# Altium integrated library Lattice CPLD ispLSI.IntLib: 471 symbols (part 1 of 26) (continued)
## ispLSI1016E-125LJ (continued)

## ispLSI1016E-125LT44
designator U?
In-System Programmable High-Density PLD; Note: Pins 8, 18, 27, 30 & 40 have dual function capability; Pin 40 is software selectable.; Published: 23-Sep-2002; LatestRevisionDate: 13-Apr-2006; LatestRevisionNote: IPC-7351 Footprint Added.; DatasheetVersion: Oct-1998; PackageVersion: pkg_32, Aug-2005; PackageReference: TQFP44; Publisher: Altium Limited; PackageDescription: 44-Pin Thin Quad Flat Pack 0.8 mm Pitch; ComponentLink1Description: Manufacturer Link; ComponentLink1URL: http://www.latticesemi.com/products/mature/index.cfm; ComponentLink2Description: Datasheet; ComponentLink2URL: http://www.latticesemi.com/lit/docs/datasheets/cpld/1016e.pdf
footprint TQFP44_N (Thin QFP, 44-Leads, Body 10x10mm, Pitch 0.8mm, IPC Medium Density)
footprint TQFP44_L (Thin QFP, 44-Leads, Body 10x10mm, Pitch 0.8mm, IPC High Density)
footprint TQFP44_M (Thin QFP, 44-Leads, Body 10x10mm, Pitch 0.8mm, IPC Low Density)
3D model 1016E-TQFP44 (44-Pin Thin Quad Flat Pack 0.8 mm Pitch)
pins: 1 I/O28 (io), 2 I/O29 (io), 3 I/O30 (io), 4 I/O31 (io), 5 Y0 (in), 6 VCC (power), 7 ~{ispEN} (in), 8 SDI/IN0 (in), 9 I/O0 (io), 10 I/O1 (io), 11 I/O2 (io), 12 I/O3 (io), 13 I/O4 (io), 14 I/O5 (io), 15 I/O6 (io), 16 I/O7 (io), 17 GND (power), 18 SDO/IN1 (io), 19 I/O8 (io), 20 I/O9 (io), 21 I/O10 (io), 22 I/O11 (io), 23 I/O12 (io), 24 I/O13 (io), 25 I/O14 (io), 26 I/O15 (io), 27 Y2/SCLK (in), 28 VCC (power), 29 Y1/~{RESET} (in), 30 MODE/IN2 (in), 31 I/O16 (io), 32 I/O17 (io), 33 I/O18 (io), 34 I/O19 (io), 35 I/O20 (io), 36 I/O21 (io), 37 I/O22 (io), 38 I/O23 (io), 39 GND (power), 40 GOE0/IN3 (in), 41 I/O24 (io), 42 I/O25 (io), 43 I/O26 (io), 44 I/O27 (io)

## ispLSI1016EA-100LJ44
designator U?
In-System Programmable High-Density PLD; Note: Pins 2 and 35 have dual function capability which is software selectable.; Published: 23-Sep-2002; LatestRevisionDate: 13-Apr-2006; LatestRevisionNote: IPC-7351 Footprint Added.; DatasheetVersion: Jun-2000; PackageVersion: pkg_32, Aug-2005; PackageReference: PLCC44; Publisher: Altium Limited; PackageDescription: 44-Pin Leaded Chip Carrier 1.27 mm Pitch; Code_IPC: PLCC-44; ComponentLink1Description: Manufacturer Link; ComponentLink1URL: http://www.latticesemi.com/products/mature/index.cfm; ComponentLink2Description: Datasheet; ComponentLink2URL: http://www.latticesemi.com/lit/docs/datasheets/cpld/1016ea.pdf
footprint PLCC44_N (Leaded Chip Carrier, 44-Leads, Body 16.6x16.6mm, Pitch 1.27mm, IPC Medium Density)
footprint PLCC44_L (Leaded Chip Carrier, 44-Leads, Body 16.6x16.6mm, Pitch 1.27mm, IPC High Density)
footprint PLCC44_M (Leaded Chip Carrier, 44-Leads, Body 16.6x16.6mm, Pitch 1.27mm, IPC Low Density)
3D model 1016EA-PLCC44 (44-Pin Leaded Chip Carrier 1.27 mm Pitch)
pins: 1 GND (power), 2 GOE0/IN3 (in), 3 I/O24 (io), 4 I/O25 (io), 5 I/O26 (io), 6 I/O27 (io), 7 I/O28 (io), 8 I/O29 (io), 9 I/O30 (io), 10 I/O31 (io), 11 Y0 (in), 12 VCC (power), 13 VCCIO (power), 14 TDI (in), 15 I/O0 (io), 16 I/O1 (io), 17 I/O2 (io), 18 I/O3 (io), 19 I/O4 (io), 20 I/O5 (io), 21 I/O6 (io), 22 I/O7 (io), 23 GND (power), 24 TDO (in), 25 I/O8 (io), 26 I/O9 (io), 27 I/O10 (io), 28 I/O11 (io), 29 I/O12 (io), 30 I/O13 (io), 31 I/O14 (io), 32 I/O15 (io), 33 TCK (in), 34 VCC (power), 35 Y1/~{RESET} (in), 36 TMS (in), 37 I/O16 (io), 38 I/O17 (io), 39 I/O18 (io), 40 I/O19 (io), 41 I/O20 (io), 42 I/O21 (io), 43 I/O22 (io), 44 I/O23 (io)

## ispLSI1016EA-100LT44
designator U?
In-System Programmable High-Density PLD; Note: Pins 2 and 35 have dual function capability which is software selectable.; Published: 23-Sep-2002; LatestRevisionDate: 13-Apr-2006; LatestRevisionNote: IPC-7351 Footprint Added.; DatasheetVersion: Jun-2000; PackageVersion: pkg_32, Aug-2005; PackageReference: TQFP44; Publisher: Altium Limited; PackageDescription: 44-Pin Thin Quad Flat Pack 0.8 mm Pitch; ComponentLink1Description: Manufacturer Link; ComponentLink1URL: http://www.latticesemi.com/products/mature/index.cfm; ComponentLink2Description: Datasheet; ComponentLink2URL: http://www.latticesemi.com/lit/docs/datasheets/cpld/1016ea.pdf
footprint TQFP44_N (Thin QFP, 44-Leads, Body 10x10mm, Pitch 0.8mm, IPC Medium Density)
footprint TQFP44_L (Thin QFP, 44-Leads, Body 10x10mm, Pitch 0.8mm, IPC High Density)
footprint TQFP44_M (Thin QFP, 44-Leads, Body 10x10mm, Pitch 0.8mm, IPC Low Density)
3D model 1016EA-TQFP44 (44-Pin Thin Quad Flat Pack 0.8 mm Pitch)
pins: 1 I/O28 (io), 2 I/O29 (io), 3 I/O30 (io), 4 I/O31 (io), 5 Y0 (in), 6 VCC (power), 7 VCCIO (power), 8 TDI (in), 9 I/O0 (io), 10 I/O1 (io), 11 I/O2 (io), 12 I/O3 (io), 13 I/O4 (io), 14 I/O5 (io), 15 I/O6 (io), 16 I/O7 (io), 17 GND (power), 18 TDO (in), 19 I/O8 (io), 20 I/O9 (io), 21 I/O10 (io), 22 I/O11 (io), 23 I/O12 (io), 24 I/O13 (io), 25 I/O14 (io), 26 I/O15 (io), 27 TCK (in), 28 VCC (power), 29 Y1/~{RESET} (in), 30 TMS (in), 31 I/O16 (io), 32 I/O17 (io), 33 I/O18 (io), 34 I/O19 (io), 35 I/O20 (io), 36 I/O21 (io), 37 I/O22 (io), 38 I/O23 (io), 39 GND (power), 40 GOE0/IN3 (in), 41 I/O24 (io), 42 I/O25 (io), 43 I/O26 (io), 44 I/O27 (io)

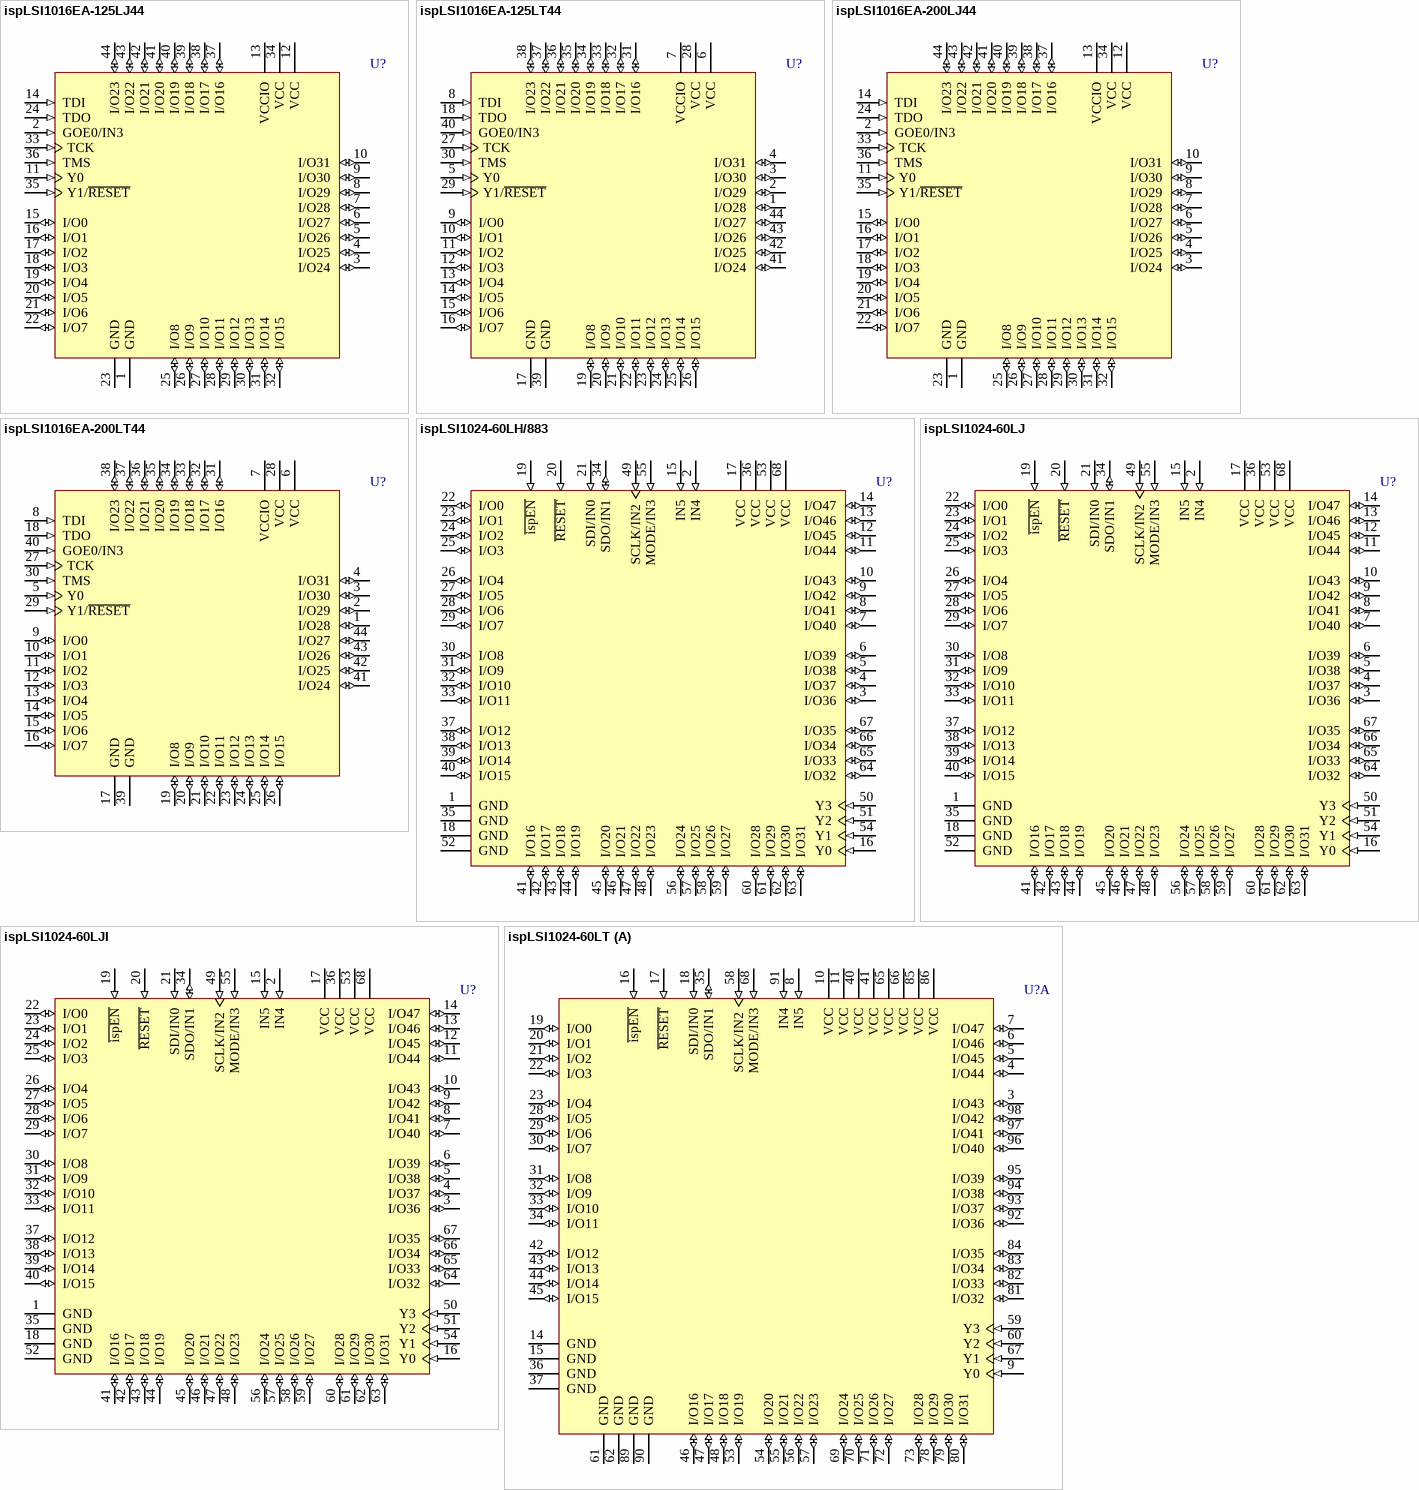
[diagram p3: symbols ispLSI1016EA-125LJ44 to ispLSI1024-60LT]

## ispLSI1016EA-125LJ44
designator U?
In-System Programmable High-Density PLD; Note: Pins 2 and 35 have dual function capability which is software selectable.; Published: 23-Sep-2002; LatestRevisionDate: 13-Apr-2006; LatestRevisionNote: IPC-7351 Footprint Added.; DatasheetVersion: Jun-2000; PackageVersion: pkg_32, Aug-2005; PackageReference: PLCC44; Publisher: Altium Limited; PackageDescription: 44-Pin Leaded Chip Carrier 1.27 mm Pitch; Code_IPC: PLCC-44; ComponentLink1Description: Manufacturer Link; ComponentLink1URL: http://www.latticesemi.com/products/mature/index.cfm; ComponentLink2Description: Datasheet; ComponentLink2URL: http://www.latticesemi.com/lit/docs/datasheets/cpld/1016ea.pdf
footprint PLCC44_N (Leaded Chip Carrier, 44-Leads, Body 16.6x16.6mm, Pitch 1.27mm, IPC Medium Density)
footprint PLCC44_L (Leaded Chip Carrier, 44-Leads, Body 16.6x16.6mm, Pitch 1.27mm, IPC High Density)
footprint PLCC44_M (Leaded Chip Carrier, 44-Leads, Body 16.6x16.6mm, Pitch 1.27mm, IPC Low Density)
3D model 1016EA-PLCC44 (44-Pin Leaded Chip Carrier 1.27 mm Pitch)
pins: 1 GND (power), 2 GOE0/IN3 (in), 3 I/O24 (io), 4 I/O25 (io), 5 I/O26 (io), 6 I/O27 (io), 7 I/O28 (io), 8 I/O29 (io), 9 I/O30 (io), 10 I/O31 (io), 11 Y0 (in), 12 VCC (power), 13 VCCIO (power), 14 TDI (in), 15 I/O0 (io), 16 I/O1 (io), 17 I/O2 (io), 18 I/O3 (io), 19 I/O4 (io), 20 I/O5 (io), 21 I/O6 (io), 22 I/O7 (io), 23 GND (power), 24 TDO (in), 25 I/O8 (io), 26 I/O9 (io), 27 I/O10 (io), 28 I/O11 (io), 29 I/O12 (io), 30 I/O13 (io), 31 I/O14 (io), 32 I/O15 (io), 33 TCK (in), 34 VCC (power), 35 Y1/~{RESET} (in), 36 TMS (in), 37 I/O16 (io), 38 I/O17 (io), 39 I/O18 (io), 40 I/O19 (io), 41 I/O20 (io), 42 I/O21 (io), 43 I/O22 (io), 44 I/O23 (io)

## ispLSI1016EA-125LT44
designator U?
In-System Programmable High-Density PLD; Note: Pins 2 and 35 have dual function capability which is software selectable.; Published: 23-Sep-2002; LatestRevisionDate: 13-Apr-2006; LatestRevisionNote: IPC-7351 Footprint Added.; DatasheetVersion: Jun-2000; PackageVersion: pkg_32, Aug-2005; PackageReference: TQFP44; Publisher: Altium Limited; PackageDescription: 44-Pin Thin Quad Flat Pack 0.8 mm Pitch; ComponentLink1Description: Manufacturer Link; ComponentLink1URL: http://www.latticesemi.com/products/mature/index.cfm; ComponentLink2Description: Datasheet; ComponentLink2URL: http://www.latticesemi.com/lit/docs/datasheets/cpld/1016ea.pdf
footprint TQFP44_N (Thin QFP, 44-Leads, Body 10x10mm, Pitch 0.8mm, IPC Medium Density)
footprint TQFP44_L (Thin QFP, 44-Leads, Body 10x10mm, Pitch 0.8mm, IPC High Density)
footprint TQFP44_M (Thin QFP, 44-Leads, Body 10x10mm, Pitch 0.8mm, IPC Low Density)
3D model 1016EA-TQFP44 (44-Pin Thin Quad Flat Pack 0.8 mm Pitch)
pins: 1 I/O28 (io), 2 I/O29 (io), 3 I/O30 (io), 4 I/O31 (io), 5 Y0 (in), 6 VCC (power), 7 VCCIO (power), 8 TDI (in), 9 I/O0 (io), 10 I/O1 (io), 11 I/O2 (io), 12 I/O3 (io), 13 I/O4 (io), 14 I/O5 (io), 15 I/O6 (io), 16 I/O7 (io), 17 GND (power), 18 TDO (in), 19 I/O8 (io), 20 I/O9 (io), 21 I/O10 (io), 22 I/O11 (io), 23 I/O12 (io), 24 I/O13 (io), 25 I/O14 (io), 26 I/O15 (io), 27 TCK (in), 28 VCC (power), 29 Y1/~{RESET} (in), 30 TMS (in), 31 I/O16 (io), 32 I/O17 (io), 33 I/O18 (io), 34 I/O19 (io), 35 I/O20 (io), 36 I/O21 (io), 37 I/O22 (io), 38 I/O23 (io), 39 GND (power), 40 GOE0/IN3 (in), 41 I/O24 (io), 42 I/O25 (io), 43 I/O26 (io), 44 I/O27 (io)

## ispLSI1016EA-200LJ44
designator U?
In-System Programmable High-Density PLD; Note: Pins 2 and 35 have dual function capability which is software selectable.; Published: 23-Sep-2002; LatestRevisionDate: 13-Apr-2006; LatestRevisionNote: IPC-7351 Footprint Added.; DatasheetVersion: Jun-2000; PackageVersion: pkg_32, Aug-2005; PackageReference: PLCC44; Publisher: Altium Limited; PackageDescription: 44-Pin Leaded Chip Carrier 1.27 mm Pitch; Code_IPC: PLCC-44; ComponentLink1Description: Manufacturer Link; ComponentLink1URL: http://www.latticesemi.com/products/mature/index.cfm; ComponentLink2Description: Datasheet; ComponentLink2URL: http://www.latticesemi.com/lit/docs/datasheets/cpld/1016ea.pdf
footprint PLCC44_N (Leaded Chip Carrier, 44-Leads, Body 16.6x16.6mm, Pitch 1.27mm, IPC Medium Density)
footprint PLCC44_L (Leaded Chip Carrier, 44-Leads, Body 16.6x16.6mm, Pitch 1.27mm, IPC High Density)
footprint PLCC44_M (Leaded Chip Carrier, 44-Leads, Body 16.6x16.6mm, Pitch 1.27mm, IPC Low Density)
3D model 1016EA-PLCC44 (44-Pin Leaded Chip Carrier 1.27 mm Pitch)
pins: 1 GND (power), 2 GOE0/IN3 (in), 3 I/O24 (io), 4 I/O25 (io), 5 I/O26 (io), 6 I/O27 (io), 7 I/O28 (io), 8 I/O29 (io), 9 I/O30 (io), 10 I/O31 (io), 11 Y0 (in), 12 VCC (power), 13 VCCIO (power), 14 TDI (in), 15 I/O0 (io), 16 I/O1 (io), 17 I/O2 (io), 18 I/O3 (io), 19 I/O4 (io), 20 I/O5 (io), 21 I/O6 (io), 22 I/O7 (io), 23 GND (power), 24 TDO (in), 25 I/O8 (io), 26 I/O9 (io), 27 I/O10 (io), 28 I/O11 (io), 29 I/O12 (io), 30 I/O13 (io), 31 I/O14 (io), 32 I/O15 (io), 33 TCK (in), 34 VCC (power), 35 Y1/~{RESET} (in), 36 TMS (in), 37 I/O16 (io), 38 I/O17 (io), 39 I/O18 (io), 40 I/O19 (io), 41 I/O20 (io), 42 I/O21 (io), 43 I/O22 (io), 44 I/O23 (io)

## ispLSI1016EA-200LT44
designator U?
In-System Programmable High-Density PLD; Note: Pins 2 and 35 have dual function capability which is software selectable.; Published: 23-Sep-2002; LatestRevisionDate: 13-Apr-2006; LatestRevisionNote: IPC-7351 Footprint Added.; DatasheetVersion: Jun-2000; PackageVersion: pkg_32, Aug-2005; PackageReference: TQFP44; Publisher: Altium Limited; PackageDescription: 44-Pin Thin Quad Flat Pack 0.8 mm Pitch; ComponentLink1Description: Manufacturer Link; ComponentLink1URL: http://www.latticesemi.com/products/mature/index.cfm; ComponentLink2Description: Datasheet; ComponentLink2URL: http://www.latticesemi.com/lit/docs/datasheets/cpld/1016ea.pdf
footprint TQFP44_N (Thin QFP, 44-Leads, Body 10x10mm, Pitch 0.8mm, IPC Medium Density)
footprint TQFP44_L (Thin QFP, 44-Leads, Body 10x10mm, Pitch 0.8mm, IPC High Density)
footprint TQFP44_M (Thin QFP, 44-Leads, Body 10x10mm, Pitch 0.8mm, IPC Low Density)
3D model 1016EA-TQFP44 (44-Pin Thin Quad Flat Pack 0.8 mm Pitch)
pins: 1 I/O28 (io), 2 I/O29 (io), 3 I/O30 (io), 4 I/O31 (io), 5 Y0 (in), 6 VCC (power), 7 VCCIO (power), 8 TDI (in), 9 I/O0 (io), 10 I/O1 (io), 11 I/O2 (io), 12 I/O3 (io), 13 I/O4 (io), 14 I/O5 (io), 15 I/O6 (io), 16 I/O7 (io), 17 GND (power), 18 TDO (in), 19 I/O8 (io), 20 I/O9 (io), 21 I/O10 (io), 22 I/O11 (io), 23 I/O12 (io), 24 I/O13 (io), 25 I/O14 (io), 26 I/O15 (io), 27 TCK (in), 28 VCC (power), 29 Y1/~{RESET} (in), 30 TMS (in), 31 I/O16 (io), 32 I/O17 (io), 33 I/O18 (io), 34 I/O19 (io), 35 I/O20 (io), 36 I/O21 (io), 37 I/O22 (io), 38 I/O23 (io), 39 GND (power), 40 GOE0/IN3 (in), 41 I/O24 (io), 42 I/O25 (io), 43 I/O26 (io), 44 I/O27 (io)

## ispLSI1024-60LH/883
designator U?
High-Density Programmable Logic; Published: 8-Jun-2000; LatestRevisionDate: 13-Apr-2006; LatestRevisionNote: IPC-7351 Footprint Added.; DatasheetVersion: 1994; PackageVersion: pkg_32, Aug-2005; PackageReference: JLCC68; Publisher: Altium Limited; PackageDescription: 68-Pin Leaded Chip Carrier 1.27 mm Pitch; ComponentLink1Description: Manufacturer Link; ComponentLink1URL: http://www.latticesemi.com/products/mature/index.cfm; ComponentLink2Description: Datasheet; ComponentLink2URL: http://www.latticesemi.com/lit/docs/military/1024.pdf
footprint JLCC68_N (Leaded Chip Carrier, 68-Leads, Body 24x24mm, Pitch 1.27mm, IPC Medium Density)
footprint JLCC68_L (Leaded Chip Carrier, 68-Leads, Body 24x24mm, Pitch 1.27mm, IPC High Density)
footprint JLCC68_M (Leaded Chip Carrier, 68-Leads, Body 24x24mm, Pitch 1.27mm, IPC Low Density)
3D model 1024-JLCC68 (68-Pin Leaded Chip Carrier 1.27 mm Pitch)
pins: 1 GND (power), 2 IN4 (in), 3 I/O36 (io), 4 I/O37 (io), 5 I/O38 (io), 6 I/O39 (io), 7 I/O40 (io), 8 I/O41 (io), 9 I/O42 (io), 10 I/O43 (io), 11 I/O44 (io), 12 I/O45 (io), 13 I/O46 (io), 14 I/O47 (io), 15 IN5 (in), 16 Y0 (in), 17 VCC (power), 18 GND (power), 19 ~{ispEN} (in), 20 ~{RESET} (in), 21 SDI/IN0 (in), 22 I/O0 (io), 23 I/O1 (io), 24 I/O2 (io), 25 I/O3 (io), 26 I/O4 (io), 27 I/O5 (io), 28 I/O6 (io), 29 I/O7 (io), 30 I/O8 (io), 31 I/O9 (io), 32 I/O10 (io), 33 I/O11 (io), 34 SDO/IN1 (io), 35 GND (power), 36 VCC (power), 37 I/O12 (io), 38 I/O13 (io), 39 I/O14 (io), 40 I/O15 (io), 41 I/O16 (io), 42 I/O17 (io), 43 I/O18 (io), 44 I/O19 (io), 45 I/O20 (io), 46 I/O21 (io), 47 I/O22 (io), 48 I/O23 (io), 49 SCLK/IN2 (in), 50 Y3 (in), 51 Y2 (in), 52 GND (power), 53 VCC (power), 54 Y1 (in), 55 MODE/IN3 (in), 56 I/O24 (io), 57 I/O25 (io), 58 I/O26 (io), 59 I/O27 (io), 60 I/O28 (io), 61 I/O29 (io), 62 I/O30 (io), 63 I/O31 (io), 64 I/O32 (io), 65 I/O33 (io), 66 I/O34 (io), 67 I/O35 (io), 68 VCC (power)

## ispLSI1024-60LJ
designator U?
High-Density Programmable Logic; Published: 8-Jun-2000; LatestRevisionDate: 13-Apr-2006; LatestRevisionNote: IPC-7351 Footprint Added.; DatasheetVersion: 1994; PackageVersion: pkg_32, Aug-2005; PackageReference: PLCC68; Publisher: Altium Limited; PackageDescription: 68-Pin Leaded Chip Carrier 1.27 mm Pitch; Code_IPC: PLCC-68; ComponentLink1Description: Manufacturer Link; ComponentLink1URL: http://www.latticesemi.com/products/mature/index.cfm; ComponentLink2Description: Datasheet; ComponentLink2URL: http://www.latticesemi.com/lit/docs/datasheets/cpld/1024.pdf
footprint PLCC68_N (Leaded Chip Carrier, 68-Leads, Body 24x24mm, Pitch 1.27mm, IPC Medium Density)
footprint PLCC68_L (Leaded Chip Carrier, 68-Leads, Body 24x24mm, Pitch 1.27mm, IPC High Density)
footprint PLCC68_M (Leaded Chip Carrier, 68-Leads, Body 24x24mm, Pitch 1.27mm, IPC Low Density)
3D model 1024-PLCC68 (68-Pin Leaded Chip Carrier 1.27 mm Pitch)
pins: 1 GND (power), 2 IN4 (in), 3 I/O36 (io), 4 I/O37 (io), 5 I/O38 (io), 6 I/O39 (io), 7 I/O40 (io), 8 I/O41 (io), 9 I/O42 (io), 10 I/O43 (io), 11 I/O44 (io), 12 I/O45 (io), 13 I/O46 (io), 14 I/O47 (io), 15 IN5 (in), 16 Y0 (in), 17 VCC (power), 18 GND (power), 19 ~{ispEN} (in), 20 ~{RESET} (in), 21 SDI/IN0 (in), 22 I/O0 (io), 23 I/O1 (io), 24 I/O2 (io), 25 I/O3 (io), 26 I/O4 (io), 27 I/O5 (io), 28 I/O6 (io), 29 I/O7 (io), 30 I/O8 (io), 31 I/O9 (io), 32 I/O10 (io), 33 I/O11 (io), 34 SDO/IN1 (io), 35 GND (power), 36 VCC (power), 37 I/O12 (io), 38 I/O13 (io), 39 I/O14 (io), 40 I/O15 (io), 41 I/O16 (io), 42 I/O17 (io), 43 I/O18 (io), 44 I/O19 (io), 45 I/O20 (io), 46 I/O21 (io), 47 I/O22 (io), 48 I/O23 (io), 49 SCLK/IN2 (in), 50 Y3 (in), 51 Y2 (in), 52 GND (power), 53 VCC (power), 54 Y1 (in), 55 MODE/IN3 (in), 56 I/O24 (io), 57 I/O25 (io), 58 I/O26 (io), 59 I/O27 (io), 60 I/O28 (io), 61 I/O29 (io), 62 I/O30 (io), 63 I/O31 (io), 64 I/O32 (io), 65 I/O33 (io), 66 I/O34 (io), 67 I/O35 (io), 68 VCC (power)

## ispLSI1024-60LJI
designator U?
High-Density Programmable Logic; Published: 8-Jun-2000; LatestRevisionDate: 13-Apr-2006; LatestRevisionNote: IPC-7351 Footprint Added.; DatasheetVersion: 1994; PackageVersion: pkg_32, Aug-2005; PackageReference: PLCC68; Publisher: Altium Limited; PackageDescription: 68-Pin Leaded Chip Carrier 1.27 mm Pitch; Code_IPC: PLCC-68; ComponentLink1Description: Manufacturer Link; ComponentLink1URL: http://www.latticesemi.com/products/mature/index.cfm; ComponentLink2Description: Datasheet; ComponentLink2URL: http://www.latticesemi.com/lit/docs/datasheets/cpld/1024.pdf
footprint PLCC68_N (Leaded Chip Carrier, 68-Leads, Body 24x24mm, Pitch 1.27mm, IPC Medium Density)
footprint PLCC68_L (Leaded Chip Carrier, 68-Leads, Body 24x24mm, Pitch 1.27mm, IPC High Density)
footprint PLCC68_M (Leaded Chip Carrier, 68-Leads, Body 24x24mm, Pitch 1.27mm, IPC Low Density)
3D model 1024-PLCC68 (68-Pin Leaded Chip Carrier 1.27 mm Pitch)
pins: 1 GND (power), 2 IN4 (in), 3 I/O36 (io), 4 I/O37 (io), 5 I/O38 (io), 6 I/O39 (io), 7 I/O40 (io), 8 I/O41 (io), 9 I/O42 (io), 10 I/O43 (io), 11 I/O44 (io), 12 I/O45 (io), 13 I/O46 (io), 14 I/O47 (io), 15 IN5 (in), 16 Y0 (in), 17 VCC (power), 18 GND (power), 19 ~{ispEN} (in), 20 ~{RESET} (in), 21 SDI/IN0 (in), 22 I/O0 (io), 23 I/O1 (io), 24 I/O2 (io), 25 I/O3 (io), 26 I/O4 (io), 27 I/O5 (io), 28 I/O6 (io), 29 I/O7 (io), 30 I/O8 (io), 31 I/O9 (io), 32 I/O10 (io), 33 I/O11 (io), 34 SDO/IN1 (io), 35 GND (power), 36 VCC (power), 37 I/O12 (io), 38 I/O13 (io), 39 I/O14 (io), 40 I/O15 (io), 41 I/O16 (io), 42 I/O17 (io), 43 I/O18 (io), 44 I/O19 (io), 45 I/O20 (io), 46 I/O21 (io), 47 I/O22 (io), 48 I/O23 (io), 49 SCLK/IN2 (in), 50 Y3 (in), 51 Y2 (in), 52 GND (power), 53 VCC (power), 54 Y1 (in), 55 MODE/IN3 (in), 56 I/O24 (io), 57 I/O25 (io), 58 I/O26 (io), 59 I/O27 (io), 60 I/O28 (io), 61 I/O29 (io), 62 I/O30 (io), 63 I/O31 (io), 64 I/O32 (io), 65 I/O33 (io), 66 I/O34 (io), 67 I/O35 (io), 68 VCC (power)

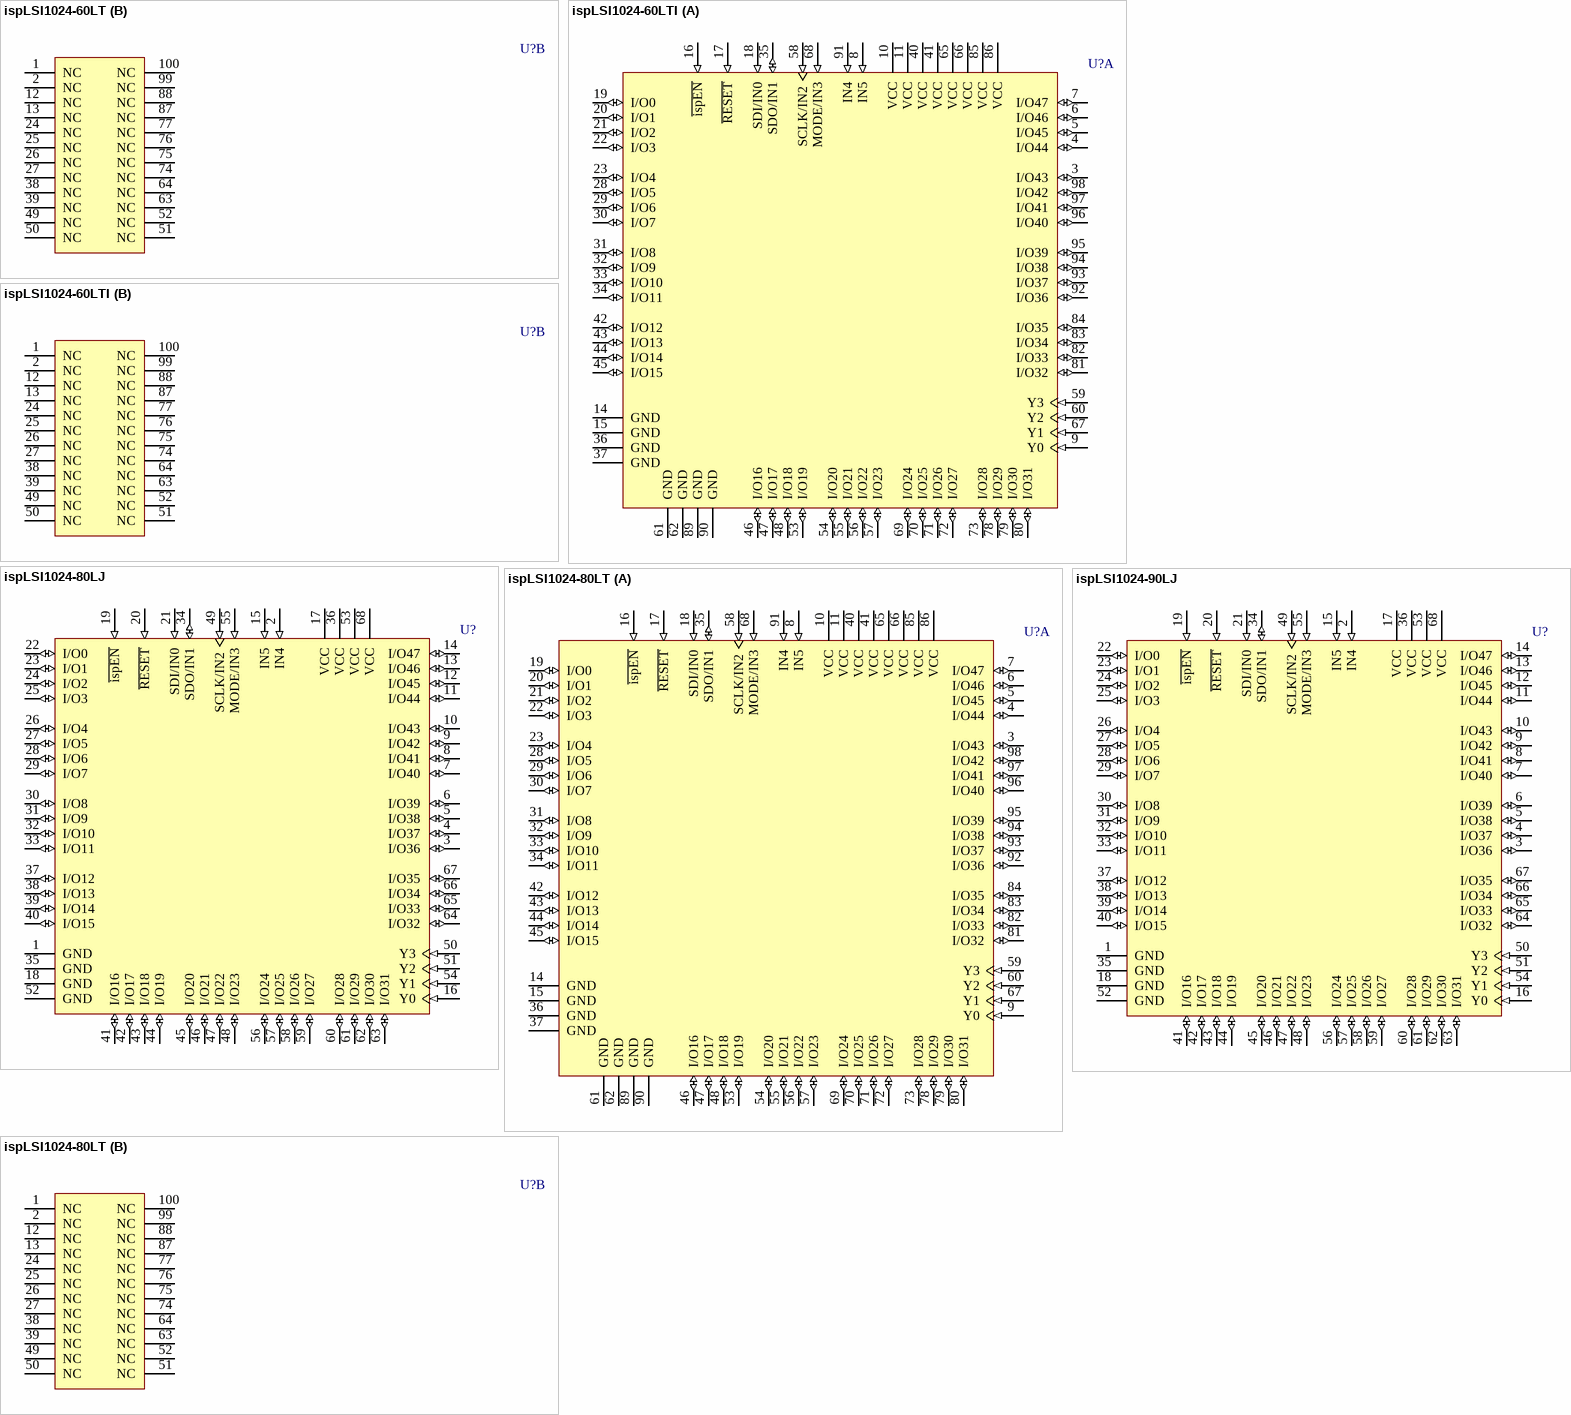
[diagram p4: symbols ispLSI1024-60LT to ispLSI1024-90LJ]

## ispLSI1024-60LT
designator U?
In-System Programmable High-Density PLD; Note: Pins 18, 35, 58 and 68 have dual function capability.; Note: NC pins are not to be connected to any active signal, VCC or GND.; Published: 23-Sep-2002; LatestRevisionDate: 13-Apr-2006; LatestRevisionNote: IPC-7351 Footprint Added.; DatasheetVersion: Feb-1999; PackageVersion: pkg_32, Aug-2005; PackageReference: TQFP100; Publisher: Altium Limited; PackageDescription: 100-Pin Thin Quad Flat Pack (TQFP100); Code_JEDEC: MS-026-BED; ComponentLink1Description: Manufacturer Link; ComponentLink1URL: http://www.latticesemi.com/products/mature/index.cfm; ComponentLink2Description: Datasheet; ComponentLink2URL: http://www.latticesemi.com/lit/docs/datasheets/cpld/1024.pdf
footprint TQFP100_N (Thin QFP, 100-Leads, Body 14x14mm, Pitch 0.5mm, IPC Medium Density)
footprint TQFP100_L (Thin QFP, 100-Leads, Body 14x14mm, Pitch 0.5mm, IPC High Density)
footprint TQFP100_M (Thin QFP, 100-Leads, Body 14x14mm, Pitch 0.5mm, IPC Low Density)
3D model 1024-TQFP100 (100-Pin Thin Quad Flat Pack (TQFP100))
part A pins: 3 I/O43 (io), 4 I/O44 (io), 5 I/O45 (io), 6 I/O46 (io), 7 I/O47 (io), 8 IN5 (in), 9 Y0 (in), 10 VCC (power), 11 VCC (power), 14 GND (power), 15 GND (power), 16 ~{ispEN} (in), 17 ~{RESET} (in), 18 SDI/IN0 (in), 19 I/O0 (io), 20 I/O1 (io), 21 I/O2 (io), 22 I/O3 (io), 23 I/O4 (io), 28 I/O5 (io), 29 I/O6 (io), 30 I/O7 (io), 31 I/O8 (io), 32 I/O9 (io), 33 I/O10 (io), 34 I/O11 (io), 35 SDO/IN1 (io), 36 GND (power), 37 GND (power), 40 VCC (power), 41 VCC (power), 42 I/O12 (io), 43 I/O13 (io), 44 I/O14 (io), 45 I/O15 (io), 46 I/O16 (io), 47 I/O17 (io), 48 I/O18 (io), 53 I/O19 (io), 54 I/O20 (io), 55 I/O21 (io), 56 I/O22 (io), 57 I/O23 (io), 58 SCLK/IN2 (in), 59 Y3 (in), 60 Y2 (in), 61 GND (power), 62 GND (power), 65 VCC (power), 66 VCC (power), 67 Y1 (in), 68 MODE/IN3 (in), 69 I/O24 (io), 70 I/O25 (io), 71 I/O26 (io), 72 I/O27 (io), 73 I/O28 (io), 78 I/O29 (io), 79 I/O30 (io), 80 I/O31 (io), 81 I/O32 (io), 82 I/O33 (io), 83 I/O34 (io), 84 I/O35 (io), 85 VCC (power), 86 VCC (power), 89 GND (power), 90 GND (power), 91 IN4 (in), 92 I/O36 (io), 93 I/O37 (io), 94 I/O38 (io), 95 I/O39 (io), 96 I/O40 (io), 97 I/O41 (io), 98 I/O42 (io)
part B pins: 1 NC, 2 NC, 12 NC, 13 NC, 24 NC, 25 NC, 26 NC, 27 NC, 38 NC, 39 NC, 49 NC, 50 NC, 51 NC, 52 NC, 63 NC, 64 NC, 74 NC, 75 NC, 76 NC, 77 NC, 87 NC, 88 NC, 99 NC, 100 NC

## ispLSI1024-60LTI
designator U?
In-System Programmable High-Density PLD; Note: Pins 18, 35, 58 and 68 have dual function capability.; Note: NC pins are not to be connected to any active signal, VCC or GND.; Published: 23-Sep-2002; LatestRevisionDate: 13-Apr-2006; LatestRevisionNote: IPC-7351 Footprint Added.; DatasheetVersion: Feb-1999; PackageVersion: pkg_32, Aug-2005; PackageReference: TQFP100; Publisher: Altium Limited; PackageDescription: 100-Pin Thin Quad Flat Pack (TQFP100); Code_JEDEC: MS-026-BED; ComponentLink1Description: Manufacturer Link; ComponentLink1URL: http://www.latticesemi.com/products/mature/index.cfm; ComponentLink2Description: Datasheet; ComponentLink2URL: http://www.latticesemi.com/lit/docs/datasheets/cpld/1024.pdf
footprint TQFP100_N (Thin QFP, 100-Leads, Body 14x14mm, Pitch 0.5mm, IPC Medium Density)
footprint TQFP100_L (Thin QFP, 100-Leads, Body 14x14mm, Pitch 0.5mm, IPC High Density)
footprint TQFP100_M (Thin QFP, 100-Leads, Body 14x14mm, Pitch 0.5mm, IPC Low Density)
3D model 1024-TQFP100 (100-Pin Thin Quad Flat Pack (TQFP100))
part A pins: 3 I/O43 (io), 4 I/O44 (io), 5 I/O45 (io), 6 I/O46 (io), 7 I/O47 (io), 8 IN5 (in), 9 Y0 (in), 10 VCC (power), 11 VCC (power), 14 GND (power), 15 GND (power), 16 ~{ispEN} (in), 17 ~{RESET} (in), 18 SDI/IN0 (in), 19 I/O0 (io), 20 I/O1 (io), 21 I/O2 (io), 22 I/O3 (io), 23 I/O4 (io), 28 I/O5 (io), 29 I/O6 (io), 30 I/O7 (io), 31 I/O8 (io), 32 I/O9 (io), 33 I/O10 (io), 34 I/O11 (io), 35 SDO/IN1 (io), 36 GND (power), 37 GND (power), 40 VCC (power), 41 VCC (power), 42 I/O12 (io), 43 I/O13 (io), 44 I/O14 (io), 45 I/O15 (io), 46 I/O16 (io), 47 I/O17 (io), 48 I/O18 (io), 53 I/O19 (io), 54 I/O20 (io), 55 I/O21 (io), 56 I/O22 (io), 57 I/O23 (io), 58 SCLK/IN2 (in), 59 Y3 (in), 60 Y2 (in), 61 GND (power), 62 GND (power), 65 VCC (power), 66 VCC (power), 67 Y1 (in), 68 MODE/IN3 (in), 69 I/O24 (io), 70 I/O25 (io), 71 I/O26 (io), 72 I/O27 (io), 73 I/O28 (io), 78 I/O29 (io), 79 I/O30 (io), 80 I/O31 (io), 81 I/O32 (io), 82 I/O33 (io), 83 I/O34 (io), 84 I/O35 (io), 85 VCC (power), 86 VCC (power), 89 GND (power), 90 GND (power), 91 IN4 (in), 92 I/O36 (io), 93 I/O37 (io), 94 I/O38 (io), 95 I/O39 (io), 96 I/O40 (io), 97 I/O41 (io), 98 I/O42 (io)
part B pins: 1 NC, 2 NC, 12 NC, 13 NC, 24 NC, 25 NC, 26 NC, 27 NC, 38 NC, 39 NC, 49 NC, 50 NC, 51 NC, 52 NC, 63 NC, 64 NC, 74 NC, 75 NC, 76 NC, 77 NC, 87 NC, 88 NC, 99 NC, 100 NC

## ispLSI1024-80LJ
designator U?
High-Density Programmable Logic; Published: 8-Jun-2000; LatestRevisionDate: 13-Apr-2006; LatestRevisionNote: IPC-7351 Footprint Added.; DatasheetVersion: 1994; PackageVersion: pkg_32, Aug-2005; PackageReference: PLCC68; Publisher: Altium Limited; PackageDescription: 68-Pin Leaded Chip Carrier 1.27 mm Pitch; Code_IPC: PLCC-68; ComponentLink1Description: Manufacturer Link; ComponentLink1URL: http://www.latticesemi.com/products/mature/index.cfm; ComponentLink2Description: Datasheet; ComponentLink2URL: http://www.latticesemi.com/lit/docs/datasheets/cpld/1024.pdf
footprint PLCC68_N (Leaded Chip Carrier, 68-Leads, Body 24x24mm, Pitch 1.27mm, IPC Medium Density)
footprint PLCC68_L (Leaded Chip Carrier, 68-Leads, Body 24x24mm, Pitch 1.27mm, IPC High Density)
footprint PLCC68_M (Leaded Chip Carrier, 68-Leads, Body 24x24mm, Pitch 1.27mm, IPC Low Density)
3D model 1024-PLCC68 (68-Pin Leaded Chip Carrier 1.27 mm Pitch)
pins: 1 GND (power), 2 IN4 (in), 3 I/O36 (io), 4 I/O37 (io), 5 I/O38 (io), 6 I/O39 (io), 7 I/O40 (io), 8 I/O41 (io), 9 I/O42 (io), 10 I/O43 (io), 11 I/O44 (io), 12 I/O45 (io), 13 I/O46 (io), 14 I/O47 (io), 15 IN5 (in), 16 Y0 (in), 17 VCC (power), 18 GND (power), 19 ~{ispEN} (in), 20 ~{RESET} (in), 21 SDI/IN0 (in), 22 I/O0 (io), 23 I/O1 (io), 24 I/O2 (io), 25 I/O3 (io), 26 I/O4 (io), 27 I/O5 (io), 28 I/O6 (io), 29 I/O7 (io), 30 I/O8 (io), 31 I/O9 (io), 32 I/O10 (io), 33 I/O11 (io), 34 SDO/IN1 (io), 35 GND (power), 36 VCC (power), 37 I/O12 (io), 38 I/O13 (io), 39 I/O14 (io), 40 I/O15 (io), 41 I/O16 (io), 42 I/O17 (io), 43 I/O18 (io), 44 I/O19 (io), 45 I/O20 (io), 46 I/O21 (io), 47 I/O22 (io), 48 I/O23 (io), 49 SCLK/IN2 (in), 50 Y3 (in), 51 Y2 (in), 52 GND (power), 53 VCC (power), 54 Y1 (in), 55 MODE/IN3 (in), 56 I/O24 (io), 57 I/O25 (io), 58 I/O26 (io), 59 I/O27 (io), 60 I/O28 (io), 61 I/O29 (io), 62 I/O30 (io), 63 I/O31 (io), 64 I/O32 (io), 65 I/O33 (io), 66 I/O34 (io), 67 I/O35 (io), 68 VCC (power)

## ispLSI1024-80LT
designator U?
In-System Programmable High-Density PLD; Note: Pins 18, 35, 58 and 68 have dual function capability.; Note: NC pins are not to be connected to any active signal, VCC or GND.; Published: 23-Sep-2002; LatestRevisionDate: 13-Apr-2006; LatestRevisionNote: IPC-7351 Footprint Added.; DatasheetVersion: Feb-1999; PackageVersion: pkg_32, Aug-2005; PackageReference: TQFP100; Publisher: Altium Limited; PackageDescription: 100-Pin Thin Quad Flat Pack (TQFP100); Code_JEDEC: MS-026-BED; ComponentLink1Description: Manufacturer Link; ComponentLink1URL: http://www.latticesemi.com/products/mature/index.cfm; ComponentLink2Description: Datasheet; ComponentLink2URL: http://www.latticesemi.com/lit/docs/datasheets/cpld/1024.pdf
footprint TQFP100_N (Thin QFP, 100-Leads, Body 14x14mm, Pitch 0.5mm, IPC Medium Density)
footprint TQFP100_L (Thin QFP, 100-Leads, Body 14x14mm, Pitch 0.5mm, IPC High Density)
footprint TQFP100_M (Thin QFP, 100-Leads, Body 14x14mm, Pitch 0.5mm, IPC Low Density)
3D model 1024-TQFP100 (100-Pin Thin Quad Flat Pack (TQFP100))
part A pins: 3 I/O43 (io), 4 I/O44 (io), 5 I/O45 (io), 6 I/O46 (io), 7 I/O47 (io), 8 IN5 (in), 9 Y0 (in), 10 VCC (power), 11 VCC (power), 14 GND (power), 15 GND (power), 16 ~{ispEN} (in), 17 ~{RESET} (in), 18 SDI/IN0 (in), 19 I/O0 (io), 20 I/O1 (io), 21 I/O2 (io), 22 I/O3 (io), 23 I/O4 (io), 28 I/O5 (io), 29 I/O6 (io), 30 I/O7 (io), 31 I/O8 (io), 32 I/O9 (io), 33 I/O10 (io), 34 I/O11 (io), 35 SDO/IN1 (io), 36 GND (power), 37 GND (power), 40 VCC (power), 41 VCC (power), 42 I/O12 (io), 43 I/O13 (io), 44 I/O14 (io), 45 I/O15 (io), 46 I/O16 (io), 47 I/O17 (io), 48 I/O18 (io), 53 I/O19 (io), 54 I/O20 (io), 55 I/O21 (io), 56 I/O22 (io), 57 I/O23 (io), 58 SCLK/IN2 (in), 59 Y3 (in), 60 Y2 (in), 61 GND (power), 62 GND (power), 65 VCC (power), 66 VCC (power), 67 Y1 (in), 68 MODE/IN3 (in), 69 I/O24 (io), 70 I/O25 (io), 71 I/O26 (io), 72 I/O27 (io), 73 I/O28 (io), 78 I/O29 (io), 79 I/O30 (io), 80 I/O31 (io), 81 I/O32 (io), 82 I/O33 (io), 83 I/O34 (io), 84 I/O35 (io), 85 VCC (power), 86 VCC (power), 89 GND (power), 90 GND (power), 91 IN4 (in), 92 I/O36 (io), 93 I/O37 (io), 94 I/O38 (io), 95 I/O39 (io), 96 I/O40 (io), 97 I/O41 (io), 98 I/O42 (io)
part B pins: 1 NC, 2 NC, 12 NC, 13 NC, 24 NC, 25 NC, 26 NC, 27 NC, 38 NC, 39 NC, 49 NC, 50 NC, 51 NC, 52 NC, 63 NC, 64 NC, 74 NC, 75 NC, 76 NC, 77 NC, 87 NC, 88 NC, 99 NC, 100 NC

## ispLSI1024-90LJ
designator U?
High-Density Programmable Logic; Published: 8-Jun-2000; LatestRevisionDate: 13-Apr-2006; LatestRevisionNote: IPC-7351 Footprint Added.; DatasheetVersion: 1994; PackageVersion: pkg_32, Aug-2005; PackageReference: PLCC68; Publisher: Altium Limited; PackageDescription: 68-Pin Leaded Chip Carrier 1.27 mm Pitch; Code_IPC: PLCC-68; ComponentLink1Description: Manufacturer Link; ComponentLink1URL: http://www.latticesemi.com/products/mature/index.cfm; ComponentLink2Description: Datasheet; ComponentLink2URL: http://www.latticesemi.com/lit/docs/datasheets/cpld/1024.pdf
footprint PLCC68_N (Leaded Chip Carrier, 68-Leads, Body 24x24mm, Pitch 1.27mm, IPC Medium Density)
footprint PLCC68_L (Leaded Chip Carrier, 68-Leads, Body 24x24mm, Pitch 1.27mm, IPC High Density)
footprint PLCC68_M (Leaded Chip Carrier, 68-Leads, Body 24x24mm, Pitch 1.27mm, IPC Low Density)
3D model 1024-PLCC68 (68-Pin Leaded Chip Carrier 1.27 mm Pitch)
pins: 1 GND (power), 2 IN4 (in), 3 I/O36 (io), 4 I/O37 (io), 5 I/O38 (io), 6 I/O39 (io), 7 I/O40 (io), 8 I/O41 (io), 9 I/O42 (io), 10 I/O43 (io), 11 I/O44 (io), 12 I/O45 (io), 13 I/O46 (io), 14 I/O47 (io), 15 IN5 (in), 16 Y0 (in), 17 VCC (power), 18 GND (power), 19 ~{ispEN} (in), 20 ~{RESET} (in), 21 SDI/IN0 (in), 22 I/O0 (io), 23 I/O1 (io), 24 I/O2 (io), 25 I/O3 (io), 26 I/O4 (io), 27 I/O5 (io), 28 I/O6 (io), 29 I/O7 (io), 30 I/O8 (io), 31 I/O9 (io), 32 I/O10 (io), 33 I/O11 (io), 34 SDO/IN1 (io), 35 GND (power), 36 VCC (power), 37 I/O12 (io), 38 I/O13 (io), 39 I/O14 (io), 40 I/O15 (io), 41 I/O16 (io), 42 I/O17 (io), 43 I/O18 (io), 44 I/O19 (io), 45 I/O20 (io), 46 I/O21 (io), 47 I/O22 (io), 48 I/O23 (io), 49 SCLK/IN2 (in), 50 Y3 (in), 51 Y2 (in), 52 GND (power), 53 VCC (power), 54 Y1 (in), 55 MODE/IN3 (in), 56 I/O24 (io), 57 I/O25 (io), 58 I/O26 (io), 59 I/O27 (io), 60 I/O28 (io), 61 I/O29 (io), 62 I/O30 (io), 63 I/O31 (io), 64 I/O32 (io), 65 I/O33 (io), 66 I/O34 (io), 67 I/O35 (io), 68 VCC (power)

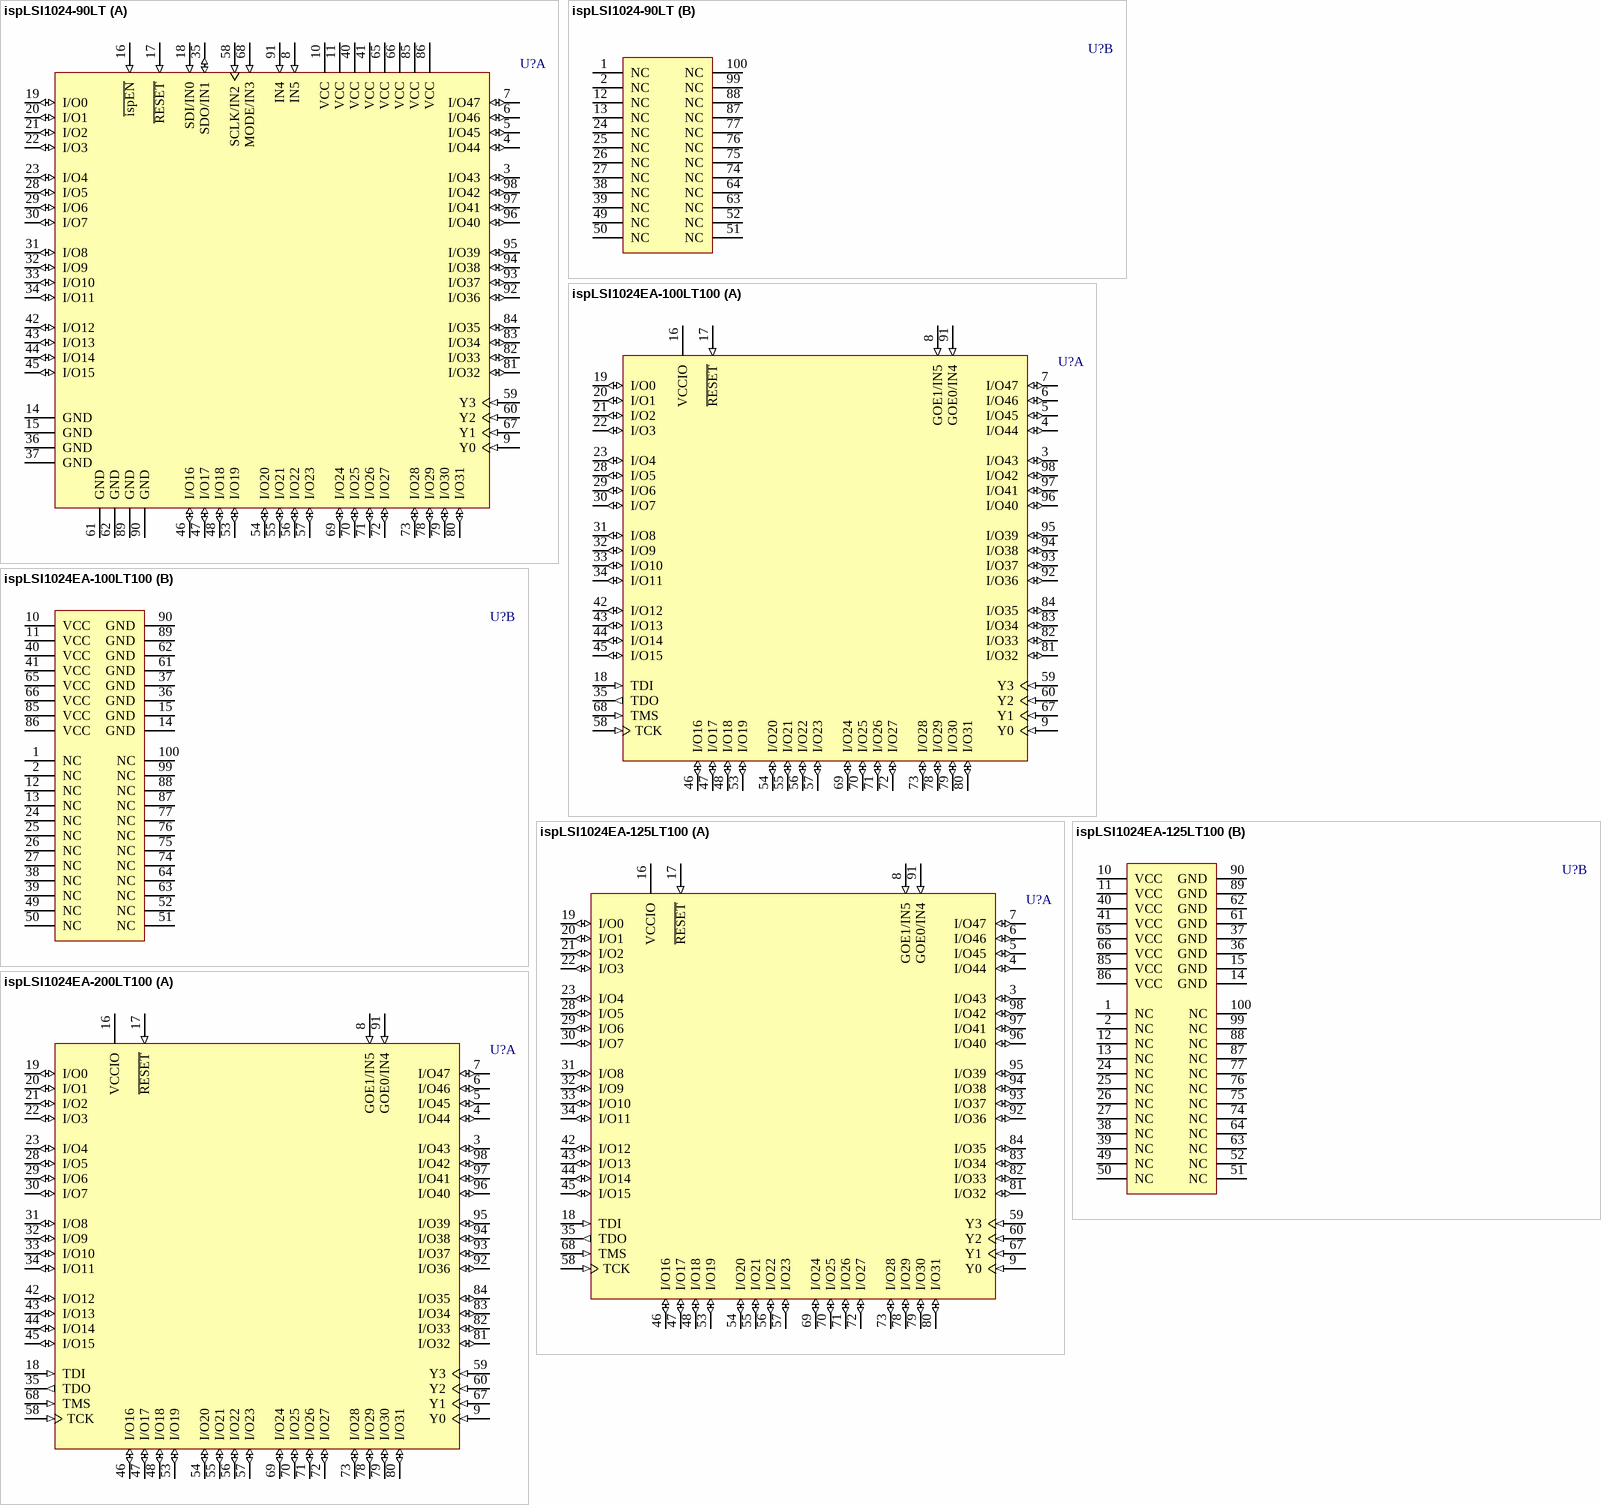
[diagram p5: symbols ispLSI1024-90LT to ispLSI1024EA-200LT100]

## ispLSI1024-90LT
designator U?
In-System Programmable High-Density PLD; Note: Pins 18, 35, 58 and 68 have dual function capability.; Note: NC pins are not to be connected to any active signal, VCC or GND.; Published: 23-Sep-2002; LatestRevisionDate: 13-Apr-2006; LatestRevisionNote: IPC-7351 Footprint Added.; DatasheetVersion: Feb-1999; PackageVersion: pkg_32, Aug-2005; PackageReference: TQFP100; Publisher: Altium Limited; PackageDescription: 100-Pin Thin Quad Flat Pack (TQFP100); Code_JEDEC: MS-026-BED; ComponentLink1Description: Manufacturer Link; ComponentLink1URL: http://www.latticesemi.com/products/mature/index.cfm; ComponentLink2Description: Datasheet; ComponentLink2URL: http://www.latticesemi.com/lit/docs/datasheets/cpld/1024.pdf
footprint TQFP100_N (Thin QFP, 100-Leads, Body 14x14mm, Pitch 0.5mm, IPC Medium Density)
footprint TQFP100_L (Thin QFP, 100-Leads, Body 14x14mm, Pitch 0.5mm, IPC High Density)
footprint TQFP100_M (Thin QFP, 100-Leads, Body 14x14mm, Pitch 0.5mm, IPC Low Density)
3D model 1024-TQFP100 (100-Pin Thin Quad Flat Pack (TQFP100))
part A pins: 3 I/O43 (io), 4 I/O44 (io), 5 I/O45 (io), 6 I/O46 (io), 7 I/O47 (io), 8 IN5 (in), 9 Y0 (in), 10 VCC (power), 11 VCC (power), 14 GND (power), 15 GND (power), 16 ~{ispEN} (in), 17 ~{RESET} (in), 18 SDI/IN0 (in), 19 I/O0 (io), 20 I/O1 (io), 21 I/O2 (io), 22 I/O3 (io), 23 I/O4 (io), 28 I/O5 (io), 29 I/O6 (io), 30 I/O7 (io), 31 I/O8 (io), 32 I/O9 (io), 33 I/O10 (io), 34 I/O11 (io), 35 SDO/IN1 (io), 36 GND (power), 37 GND (power), 40 VCC (power), 41 VCC (power), 42 I/O12 (io), 43 I/O13 (io), 44 I/O14 (io), 45 I/O15 (io), 46 I/O16 (io), 47 I/O17 (io), 48 I/O18 (io), 53 I/O19 (io), 54 I/O20 (io), 55 I/O21 (io), 56 I/O22 (io), 57 I/O23 (io), 58 SCLK/IN2 (in), 59 Y3 (in), 60 Y2 (in), 61 GND (power), 62 GND (power), 65 VCC (power), 66 VCC (power), 67 Y1 (in), 68 MODE/IN3 (in), 69 I/O24 (io), 70 I/O25 (io), 71 I/O26 (io), 72 I/O27 (io), 73 I/O28 (io), 78 I/O29 (io), 79 I/O30 (io), 80 I/O31 (io), 81 I/O32 (io), 82 I/O33 (io), 83 I/O34 (io), 84 I/O35 (io), 85 VCC (power), 86 VCC (power), 89 GND (power), 90 GND (power), 91 IN4 (in), 92 I/O36 (io), 93 I/O37 (io), 94 I/O38 (io), 95 I/O39 (io), 96 I/O40 (io), 97 I/O41 (io), 98 I/O42 (io)
part B pins: 1 NC, 2 NC, 12 NC, 13 NC, 24 NC, 25 NC, 26 NC, 27 NC, 38 NC, 39 NC, 49 NC, 50 NC, 51 NC, 52 NC, 63 NC, 64 NC, 74 NC, 75 NC, 76 NC, 77 NC, 87 NC, 88 NC, 99 NC, 100 NC